# Altium footprint library 2.50-TO直插元件封装.PcbLib: 59 footprints (part 2 of 4)
Each footprint in its own frame and in the unit in brackets; x right, y up, seen from the top. Pads: shape width x height; smd on the part's side, far side on the other; paste and mask are expansions set on the pad; w line width, h text height; cw(c..) or ccw(c..) is an arc to the next point about the centre after c.
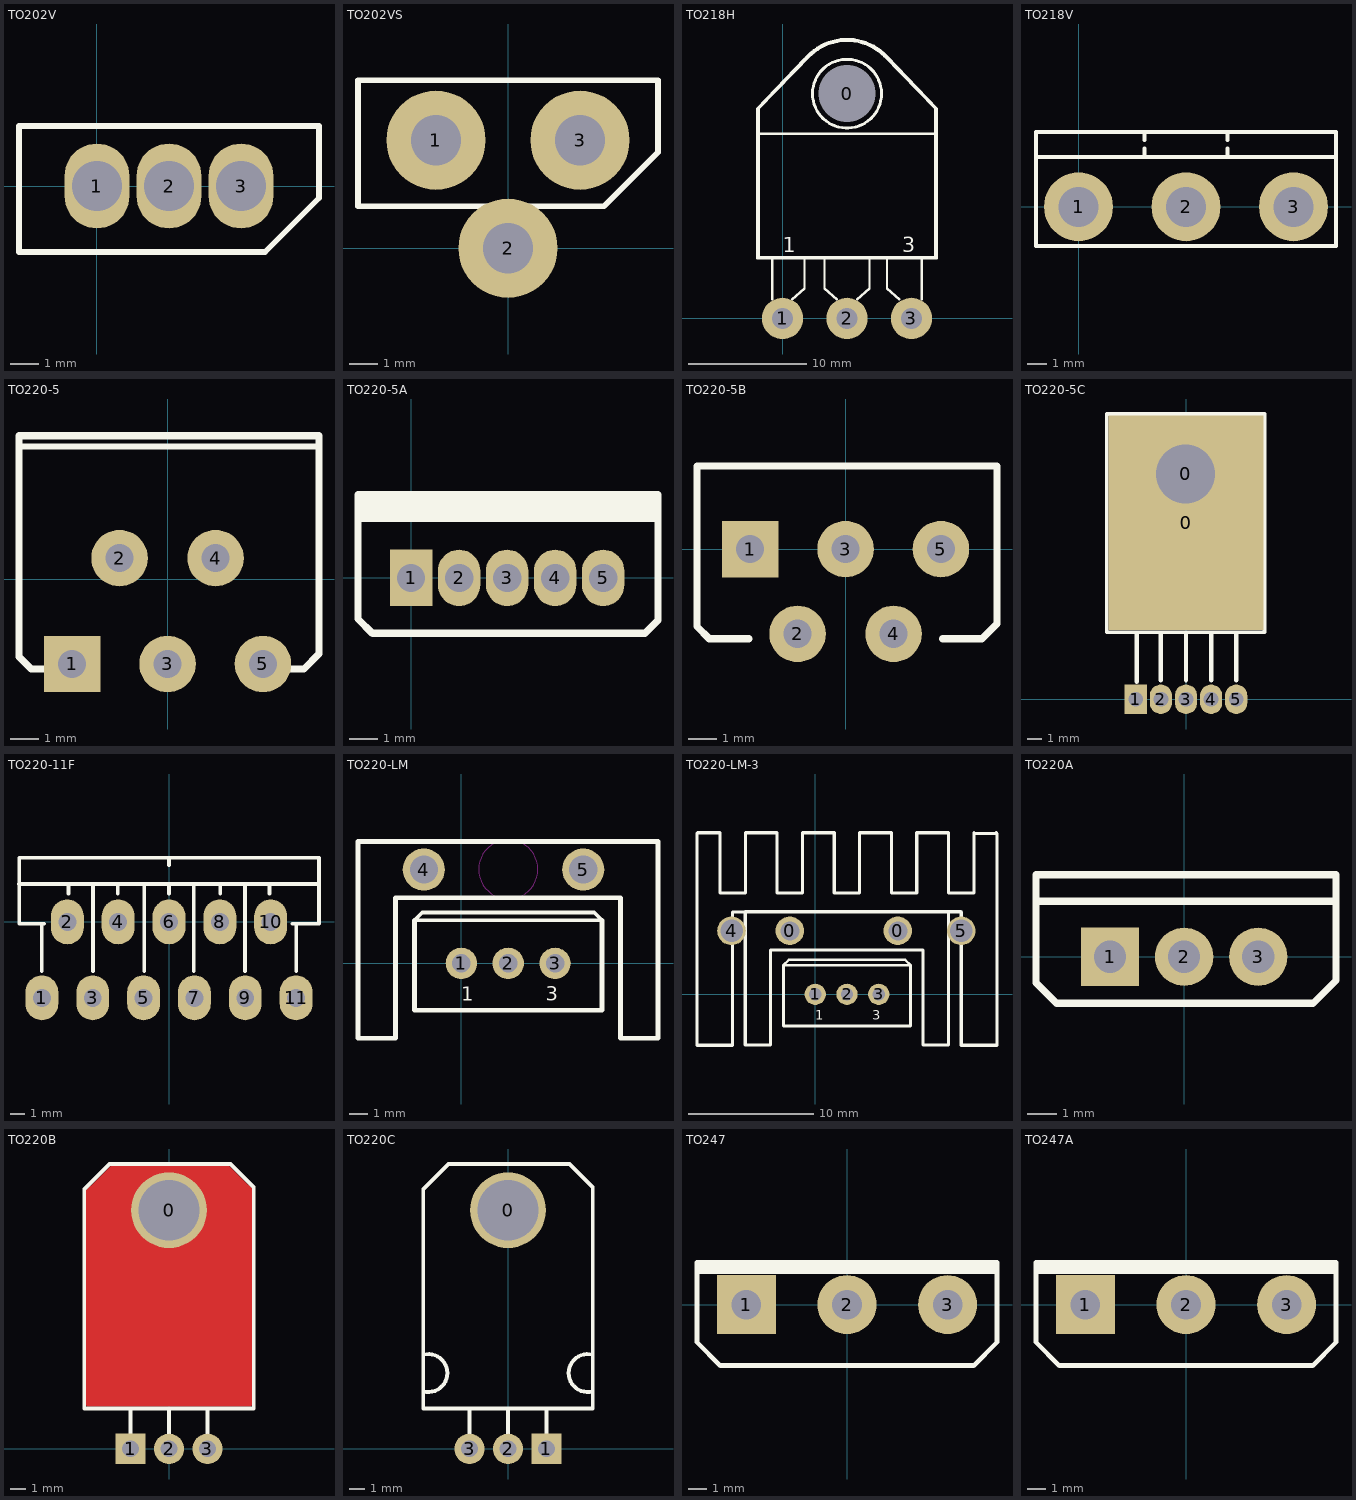
[diagram p1: the footprints below, top view; thin cyan lines are the x and y axes]

## TO202V [mil]
pads (3):
  oval 90x118.11 hole 70: 1(0,0) 2(100,0) 3(200,0)
Top Overlay:
  lines w7.87: -108.33,-91.67 -108.33,83.33 308.33,83.33 308.33,-16.67 233.33,-91.67 -108.33,-91.67

## TO202VS [mm] "封装库来自淘宝卖家 ID：黄晶宝石"
pads (3):
  round 3.5 hole 1.778: 1(-2.54,3.81) 2(0,0) 3(2.54,3.81)
Top Overlay:
  lines w0.2: -5.292,1.482 -0.71,1.482 ; 0.71,1.482 3.387,1.482
  lines w0.203: -5.292,1.482 -5.292,5.927 5.292,5.927 5.292,3.387 3.387,1.482

## TO218H [mm] "封装库来自淘宝卖家 ID：黄晶宝石"
pads (4):
  round 3.5 hole 4.826: 0(5.461,19.05)
  round 3.5 hole 1.778: 1(0,0) 2(5.461,0) 3(10.922,0)
Top Overlay:
  circle w0.254: c5.461,19.05 r2.921
  lines w0.2: -0.889,1.6 -0.889,5.08 ; 0.804,1.6 1.863,2.54 1.863,5.08 ; 1.863,22.013 -2.159,17.78 -2.159,15.663 ; 2.413,22.352 -2.032,17.78 -2.032,5.207 12.954,5.207 12.954,17.78 8.636,22.225 ; 3.556,5.08 3.556,2.54 4.614,1.6 ; 6.308,1.6 7.366,2.54 7.366,5.08 ; 8.848,5.08 8.848,2.54 9.906,1.6 ; 8.848,22.225 13.081,17.78 13.081,15.663 ; 11.811,1.6 11.811,5.08 ; -2.159,15.663 13.081,15.663 ; -2.159,15.663 -2.159,5.08 13.081,5.08 13.081,15.663
  lines w0.203: 1.859,21.967 cw(c5.461,19.05) 8.851,22.211 ; 2.401,22.332 cw(c5.461,19.05) 8.634,22.223
  text "1" at 0,5.588 h1.27
  text "3" at 10.16,5.588 h1.27
3D body "TO218H.stp": height 4.82, standoff -3, extent -1.919,-0.93 13.081,24.298

## TO218V [mm] "封装库来自淘宝卖家 ID：黄晶宝石"
pads (3):
  round 3.5 hole 2.032: 1(0,0) 2(5.461,0) 3(10.922,0)
Top Overlay:
  lines w0.2: -2.159,2.54 13.081,2.54 ; 3.344,2.54 3.344,2.963 ; 3.344,3.387 3.344,3.81 ; 7.578,2.54 7.578,2.963 ; 7.578,3.387 7.578,3.81 ; -2.159,-2 -2.159,3.81 13.081,3.81 13.081,-2 -2.159,-2
3D body "TO218V.stp": height 22.23, standoff -3, extent -2.013,-1.472 12.987,3.328

## TO220-5 [mm] "220，5"
pads (5):
  rect 2x2 hole 1: 1(-3.378,-3)
  round 2 hole 1: 2(-1.7,0.75) 3(0,-3) 4(1.7,0.75) 5(3.378,-3)
Top Overlay:
  lines w0.203: -5.207,4.699 5.334,4.699
  lines w0.254: -3.429,-3.175 -4.826,-3.175 -5.258,-2.743 -5.258,1.34 -5.258,5.08 5.362,5.08 5.362,1.432 5.362,-2.639 4.826,-3.175 3.429,-3.175
3D body "TO220-5-22.stp": height 21.35, standoff -2.64, extent -5.08,-3.16 5.08,5.08

## TO220-5A [mm] "220，5脚晶体管"
pads (5):
  rect 1.5x2 hole 1: 1(0,0)
  oval 1.5x2 hole 1: 2(1.7,0) 3(3.4,0) 4(5.1,0) 5(6.8,0)
Top Overlay:
  rectangle: -1.88,2.189 8.74,2.946
  lines w0.254: -1.88,2.102 8.74,2.102 ; -1.88,-1.454 -1.88,1.34 -1.88,2.946 8.74,2.946 8.74,1.432 8.74,-1.502 8.28,-1.962 -1.372,-1.962 -1.88,-1.454
3D body "TO220-5A.STEP": height 17.5, standoff -4, extent -1.65,-1.8 8.45,2.7

## TO220-5B [mm] "220，5脚晶体管"
pads (5):
  rect 2x2 hole 1: 1(-3.378,0)
  round 2 hole 1: 2(-1.7,-3) 3(0,0) 4(1.7,-3) 5(3.378,0)
Top Overlay:
  lines w0.254: -3.429,-3.175 -4.826,-3.175 -5.258,-2.743 -5.258,1.34 -5.258,2.946 5.362,2.946 5.362,1.432 5.362,-2.639 4.826,-3.175 3.429,-3.175
3D body "TO220-5B.STEP": height 17.5, standoff -4, extent -5.05,-3.225 5.05,2.7

## TO220-5C [mm] "220，5脚晶体管"
pads (7):
  round 4.2 hole 4: 0(-0.022,15.247)
  rect 10.5x14.5 smd: 0(0,11.938)
  rect 1.5x2 hole 1: 1(-3.4,0)
  oval 1.5x2 hole 1: 2(-1.7,0) 3(0,0) 4(1.7,0) 5(3.4,0)
Top Overlay:
  lines w0.254: -5.356,4.528 -5.356,19.304 5.312,19.304 5.312,4.528 -3.832,4.528 -5.356,4.528
  lines w0.3: -3.324,1.194 -3.324,4.369 ; -1.7,1.27 -1.7,4.445 ; 0,1.27 0,4.445 ; 1.7,1.27 1.7,4.445 ; 3.4,1.27 3.4,4.445
3D body "TO220-5C.STEP": height 2.5, standoff -5, extent -5.05,-0.225 5.05,18.1

## TO220-11F [mm] "TO22 11脚塑封"
pads (11):
  oval 2.2x3 hole 1.2: 1(-8.5,-5.08) 2(-6.8,0) 3(-5.1,-5.08) 4(-3.4,0) 5(-1.7,-5.08) 6(0,0) 7(1.7,-5.08) 8(3.4,0) 9(5.1,-5.08) 10(6.8,0) 11(8.5,-5.08)
Top Overlay:
  lines w0.254: -10.033,2.54 10.033,2.54 ; -8.509,-3.302 -8.509,-0.127 ; -8.359,-0.127 -10.01,-0.127 -10.01,4.29 10.01,4.29 10.033,4.29 10.033,-0.127 8.255,-0.127 ; -6.731,1.905 -6.731,2.54 ; -5.08,-3.302 -5.08,2.54 ; -3.429,1.905 -3.429,2.54 ; -1.651,-3.302 -1.651,2.54 ; 0,1.905 0,2.54 ; 0,3.81 0,4.29 ; 1.651,-3.302 1.651,2.54 ; 3.429,1.905 3.429,2.54 ; 5.08,-3.302 5.08,2.54 ; 6.731,1.905 6.731,2.54 ; 8.509,-3.302 8.509,-0.127
3D body "TO220-11F.STEP": height 3.5, standoff -22.65, extent -10.01,-5.255 10.01,4.29

## TO220-LM [mm]
pads (5):
  round 1.7 hole 1: 1(0,0) 2(2.54,0) 3(5.08,0)
  round 2.286 hole 1.524: 4(-2.032,5.08) 5(6.604,5.08)
Top Overlay:
  lines w0.2: -2.54,2.328 7.62,2.328 7.197,2.752 -2.117,2.752 -2.54,2.328
  lines w0.254: -2.54,2.328 -2.54,-2.529 -2.529,-2.54 7.609,-2.54 7.62,-2.529 7.62,2.328 ; 10.657,3.556 10.657,6.604 ; 10.657,6.604 10.657,-4.064 8.625,-4.064 8.625,3.556 -3.567,3.556 -3.567,-4.064 -5.599,-4.064 -5.599,1.016 -5.599,3.556 -5.599,6.604 10.657,6.604
  text "3" at 4.572,-2.032 h0.76
  text "1" at 0,-2.032 h0.76
Keep-Out Layer:
  circle w0.025: c2.545,5.094 r1.606
3D body "User Library-Package T0-220AB With Heatsing Vertical Mount-1.STEP": height 21.07, standoff -4.86, extent -5.96,-5.775 11.04,4.445

## TO220-LM-3 [mil]
height 1181.1
pads (7):
  round 90 hole 60: 0(-80,200) 0(260,200)
  round 66.93 hole 39.37: 1(0,0) 2(100,0) 3(200,0)
  round 90 hole 70.87: 4(-263.72,199.65) 5(459.82,199.65)
Top Overlay:
  lines w7.87: -100,91.67 -83.33,108.33 283.33,108.33 300,91.67 -100,91.67
  lines w10: -372.44,379.39 -372.44,507.14 ; -372.44,391.91 -372.44,507.14 ; -100,91.67 -100,-99.56 -99.56,-100 299.56,-100 300,-99.56 300,91.67 ; 419.56,140 419.56,260 ; 459.82,119.65 459.82,199.65 ; 570.28,508.93 572.44,506.77 ; 572.44,387.75 572.44,506.77 ; -372.44,507.14 -372.44,-160.61 -260.18,-160.61 -260.18,259.65 -220.78,259.65 -220.44,260 ; -372.44,507.14 -370.65,508.93 -300.18,508.93 -300.18,319.39 -220.18,319.39 -220.18,508.93 -120.18,508.93 -120.18,319.39 -40.18,319.39 -40.18,508.93 59.82,508.93 59.82,319.39 139.82,319.39 139.82,508.93 239.82,508.93 239.82,319.39 319.82,319.39 319.82,508.93 399.82,508.93 419.82,508.93 419.82,319.39 499.82,319.39 499.82,508.93 501.97,506.77 572.44,506.77 ; -220.44,260 419.56,260 ; -220.44,260 -220.44,140 -220.44,40 -220.44,-160 -140.44,-160 -140.44,140 339.56,140 339.56,-160 419.56,-160 419.56,260 ; 419.56,260 459.47,260 459.82,259.65 459.82,-160.61 572.44,-160.61 572.44,506.77
  text "1" at 0,-80 h30
  text "3" at 180,-80 h30
3D body "TO220A.STEP": height 137.8, standoff -748.03, extent -102.76,-60.24 302.75,114.17

## TO220A [mm] "220，3脚晶体管  封装库来自淘宝卖家 ID：黄晶宝石"
pads (3):
  rect 2x2 hole 1.1: 1(-2.54,0)
  round 2 hole 1.1: 2(0,0) 3(2.54,0)
Top Overlay:
  lines w0.254: -4.928,1.905 5.131,1.905 ; -5.08,-0.889 -4.369,-1.6 4.42,-1.6 5.207,-0.813 5.207,2.819 -5.08,2.819 -5.08,-0.889
3D body "TO220A.STEP": height 3.5, standoff -19, extent -5.15,-1.53 5.15,2.9

## TO220B [mm] "220，3脚晶体管  封装库来自淘宝卖家 ID：黄晶宝石"
pads (4):
  round 5 hole 4: 0(0,15.748)
  rect 2x2 hole 1.1: 1(-2.54,0)
  round 2 hole 1.1: 2(0,0) 3(2.54,0)
Top Layer:
  rectangle: -5.334,2.921 5.334,17.018
  rectangle: -3.81,16.891 4.064,18.542
  rectangle: 4.064,16.891 4.699,17.78
  rectangle: -4.572,16.891 -3.81,17.653
  rectangle: -4.318,17.653 -3.81,18.034
  rectangle: -4.826,17.018 -4.572,17.526
  rectangle: 4.445,16.891 5.143,17.335
  rectangle: 3.81,17.526 4.445,18.034
  lines w0.254: -5.207,16.891 -3.81,18.288 ; -4.826,17.018 -3.81,18.034 ; 3.937,18.288 4.826,17.272 5.334,17.018 4.699,17.526 ; -5.334,2.921 -5.334,16.637 -5.334,17.018 -4.826,17.526 -3.81,18.542 3.429,18.542 3.937,18.542 4.953,17.526 5.334,17.145 5.334,3.429 5.334,2.921 -5.08,2.921 -5.334,2.921
Top Overlay:
  lines w0.254: -2.54,0.737 -2.54,2.667 ; 0,0.711 0,2.667 ; 2.54,0.686 2.54,2.667 ; -5.588,2.667 5.588,2.667 5.588,17.272 4.064,18.796 -3.937,18.796 -5.588,17.145 -5.588,2.667
3D body "TO220B.STEP": height 4.43, standoff -3, extent -5.15,-0.25 5.15,18.5

## TO220C [mm] "220，3脚晶体管  封装库来自淘宝卖家 ID：黄晶宝石"
pads (4):
  round 5 hole 4: 0(0,15.748)
  rect 2x2 hole 1.1: 1(2.54,0)
  round 2 hole 1.1: 2(0,0) 3(-2.54,0)
Top Overlay:
  lines w0.254: -5.576,3.793 ccw(c-5.25,5) -5.576,6.207 ; -2.54,0.737 -2.54,2.667 ; 0,0.711 0,2.667 ; 2.54,0.686 2.54,2.667 ; 5.576,3.793 cw(c5.25,5) 5.576,6.207 ; -5.588,2.667 -5.588,17.145 -3.937,18.796 4.064,18.796 5.588,17.272 5.588,2.667 -5.588,2.667
3D body "TO220C.STEP": height 4.5, standoff -3.43, extent -5.15,0 5.15,18.75

## TO247 [mm] "TO247，3脚立式封装  封装库来自淘宝卖家 ID：黄晶宝石"
pads (3):
  rect 3.2x3.2 hole 1.6: 1(-5.45,0)
  round 3.2 hole 1.6: 2(0,0) 3(5.45,0)
Top Overlay:
  lines w0.254: -8.128,1.778 8.128,1.778 ; -8.128,1.778 -8.128,-2.032 -6.858,-3.302 6.858,-3.302 8.128,-2.032 8.128,1.778 ; -8.128,1.778 -8.128,2.032 ; -8.128,2.032 8.128,2.032 8.128,1.778 ; -8.128,2.032 -8.128,2.286 8.128,2.286 8.128,1.778
3D body "TO247A.STEP": height 24, standoff -6, extent -7.75,-3 7.75,2

## TO247A [mm] "247，3脚立式封装"
pads (3):
  rect 3.2x3.2 hole 1.6: 1(-5.45,0)
  round 3.2 hole 1.6: 2(0,0) 3(5.45,0)
Top Overlay:
  lines w0.254: -8.128,1.778 -8.128,2.032 ; -8.128,1.778 -8.128,-2.032 -6.858,-3.302 6.858,-3.302 8.128,-2.032 8.128,1.778 ; -8.128,1.778 8.128,1.778 ; -8.128,2.032 -8.128,2.286 8.128,2.286 8.128,1.778 ; -8.128,2.032 8.128,2.032 8.128,1.778
3D body "TO247A.STEP": height 24, standoff -6, extent -7.75,-3 7.75,2